# Altium footprint library Metric_SMD.PcbLib: 185 footprints (part 7 of 12)
Each footprint in its own frame and in the unit in brackets; x right, y up, seen from the top. Pads: shape width x height; smd on the part's side, far side on the other; paste and mask are expansions set on the pad; w line width, h text height; cw(c..) or ccw(c..) is an arc to the next point about the centre after c.
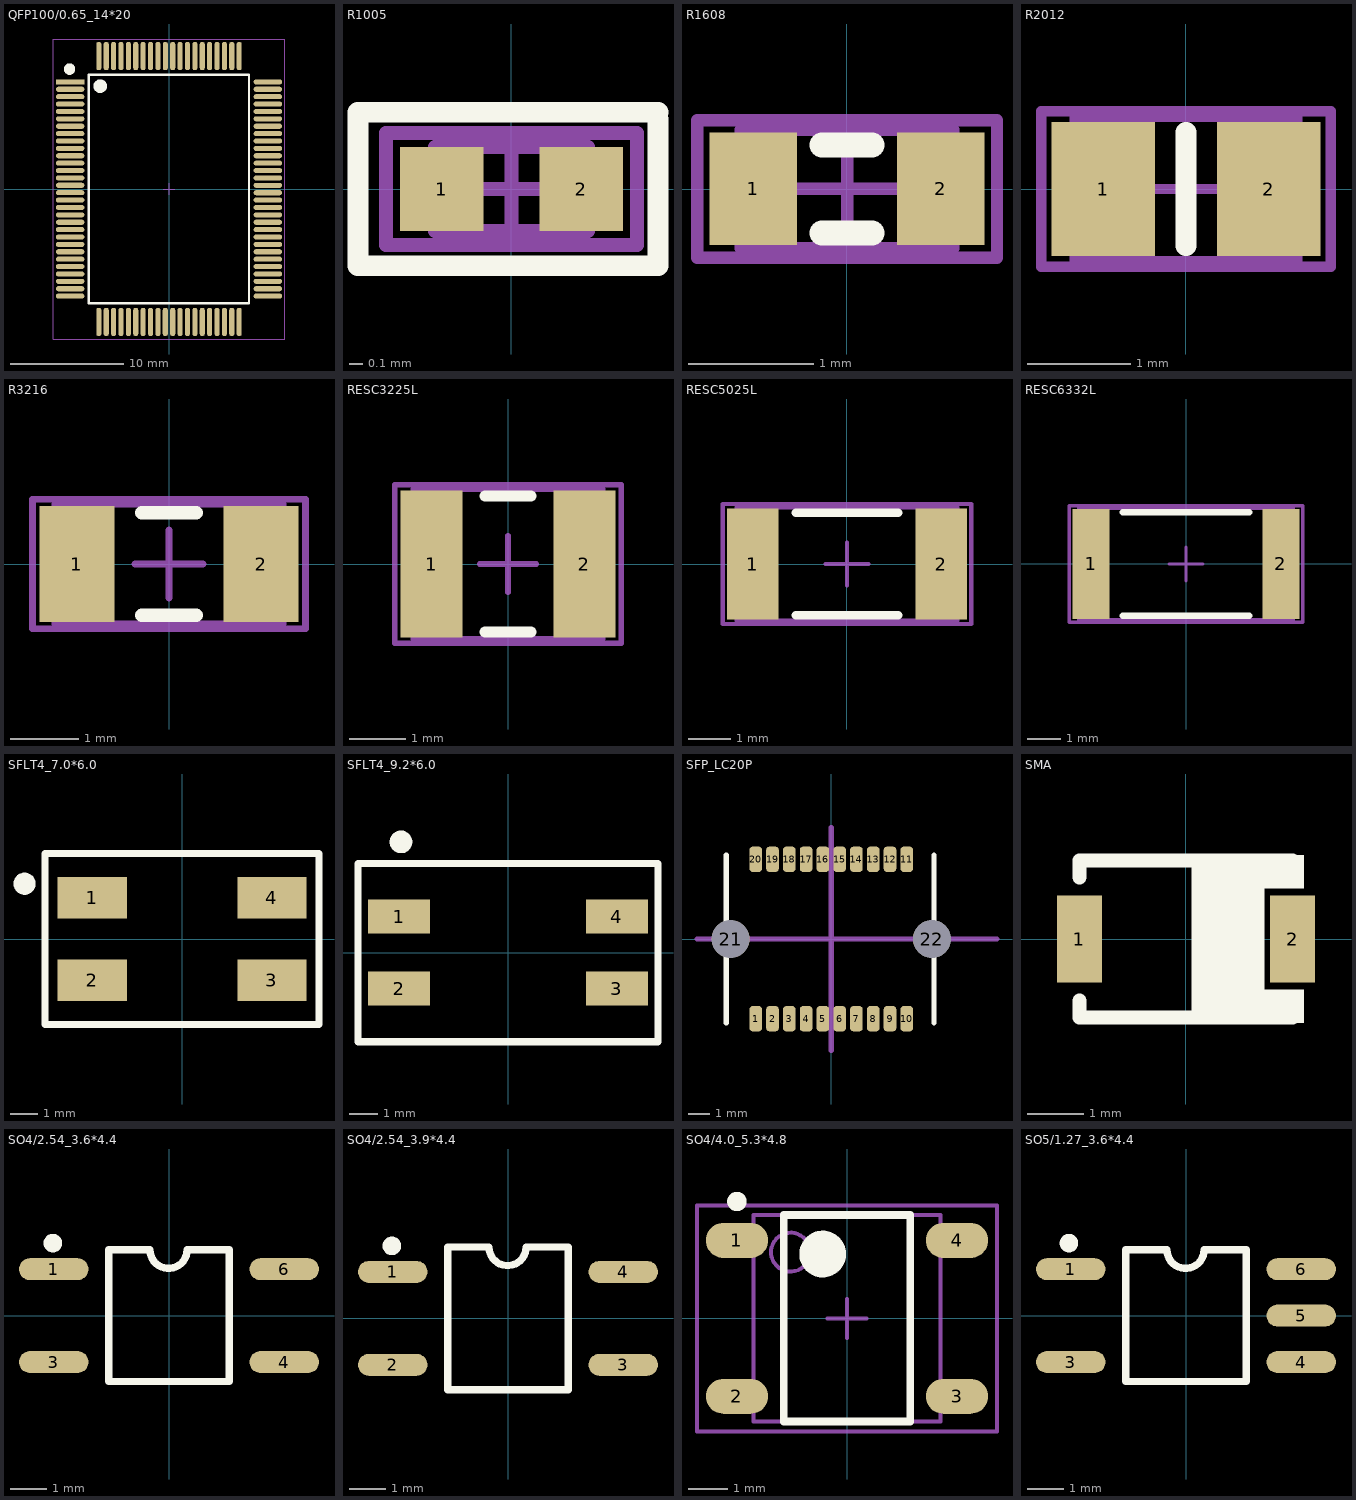
[diagram p6: the footprints below, top view; thin cyan lines are the x and y axes]

## QFP100/0.65_14*20 [mm] "QFP, 100-Leads, Body 25.1x19.1mm (max), Pitch 0.65mm, IPC Medium Density"
height 3
pads (100):
  rect 2.5x0.45 smd: 1(-8.7,9.425)
  oval 2.5x0.45 smd: 2(-8.7,8.775) 3(-8.7,8.125) 4(-8.7,7.475) 5(-8.7,6.825) 6(-8.7,6.175) 7(-8.7,5.525) 8(-8.7,4.875) 9(-8.7,4.225) 10(-8.7,3.575) 11(-8.7,2.925) 12(-8.7,2.275) 13(-8.7,1.625) 14(-8.7,0.975) 15(-8.7,0.325) 16(-8.7,-0.325) 17(-8.7,-0.975) 18(-8.7,-1.625) 19(-8.7,-2.275) 20(-8.7,-2.925) 21(-8.7,-3.575) 22(-8.7,-4.225) 23(-8.7,-4.875) 24(-8.7,-5.525) 25(-8.7,-6.175) 26(-8.7,-6.825) 27(-8.7,-7.475) 28(-8.7,-8.125) 29(-8.7,-8.775) 30(-8.7,-9.425) 51(8.7,-9.425) 52(8.7,-8.775) 53(8.7,-8.125) 54(8.7,-7.475) 55(8.7,-6.825) 56(8.7,-6.175) 57(8.7,-5.525) 58(8.7,-4.875) 59(8.7,-4.225) 60(8.7,-3.575) 61(8.7,-2.925) 62(8.7,-2.275) 63(8.7,-1.625) 64(8.7,-0.975) 65(8.7,-0.325) 66(8.7,0.325) 67(8.7,0.975) 68(8.7,1.625) 69(8.7,2.275) 70(8.7,2.925) 71(8.7,3.575) 72(8.7,4.225) 73(8.7,4.875) 74(8.7,5.525) 75(8.7,6.175) 76(8.7,6.825) 77(8.7,7.475) 78(8.7,8.125) 79(8.7,8.775) 80(8.7,9.425)
  oval 0.45x2.5 smd: 31(-6.175,-11.7) 32(-5.525,-11.7) 33(-4.875,-11.7) 34(-4.225,-11.7) 35(-3.575,-11.7) 36(-2.925,-11.7) 37(-2.275,-11.7) 38(-1.625,-11.7) 39(-0.975,-11.7) 40(-0.325,-11.7) 41(0.325,-11.7) 42(0.975,-11.7) 43(1.625,-11.7) 44(2.275,-11.7) 45(2.925,-11.7) 46(3.575,-11.7) 47(4.225,-11.7) 48(4.875,-11.7) 49(5.525,-11.7) 50(6.175,-11.7) 81(6.175,11.7) 82(5.525,11.7) 83(4.875,11.7) 84(4.225,11.7) 85(3.575,11.7) 86(2.925,11.7) 87(2.275,11.7) 88(1.625,11.7) 89(0.975,11.7) 90(0.325,11.7) 91(-0.325,11.7) 92(-0.975,11.7) 93(-1.625,11.7) 94(-2.275,11.7) 95(-2.925,11.7) 96(-3.575,11.7) 97(-4.225,11.7) 98(-4.875,11.7) 99(-5.525,11.7) 100(-6.175,11.7)
Top Overlay:
  circle w0.6: c-6.05,9.05 r0.3
  circle w0.5: c-8.75,10.55 r0.25
  lines w0.2: -7.05,-10.05 7.05,-10.05 7.05,10.05 -7.05,10.05 -7.05,-10.05
Mechanical 13:
  circle w0.1: c-6.05,9.05 r0.5
  lines w0.1: -7,-10 7,-10 7,10 -7,10 -7,-10
Mechanical 15:
  lines w0.1: -0.5,0 0.5,0 ; 0,-0.5 0,0.5 ; -10.2,-13.2 10.2,-13.2 10.2,13.2 -10.2,13.2 -10.2,-13.2
3D body: height 3, standoff 0.11, extent -7,-10 7,10

## R1005 [mm] "Chip Resistor, Body 1.1x0.5mm, IPC High Density"
height 2.54
pads (2):
  rect 0.6x0.6 smd: 1(-0.5,0) 2(0.5,0)
Top Overlay:
  lines w0.15: 1.05,0.5 1.05,-0.55 -1.1,-0.55 -1.1,0.55 1.05,0.55
Mechanical 13:
  lines w0.1: -0.55,-0.3 0.55,-0.3 0.55,0.3 -0.55,0.3 -0.55,-0.3
Mechanical 15:
  lines w0.1: -0.3,0 0.3,0 ; 0,-0.3 0,0.3 ; -0.9,-0.4 0.9,-0.4 0.9,0.4 -0.9,0.4 -0.9,-0.4
3D body: height 2.54, standoff 0, extent -0.55,-0.3 0.55,0.3

## R1608 [mm] "Chip Resistor, Body 1.6x0.8mm, IPC High Density"
height 0.9
pads (2):
  rect 0.7x0.9 smd: 1(-0.75,0) 2(0.75,0)
Top Overlay:
  lines w0.2: -0.2,-0.35 0.2,-0.35 ; -0.2,0.35 0.2,0.35
Mechanical 13:
  lines w0.1: -0.85,-0.475 -0.85,0.475 0.85,0.475 0.85,-0.475 -0.85,-0.475
Mechanical 15:
  lines w0.1: -0.475,0 0.475,0 ; 0,-0.475 0,0.475 ; -1.2,-0.55 -1.2,0.55 1.2,0.55 1.2,-0.55 -1.2,-0.55
3D body: height 0.9, standoff 0, extent -0.85,-0.475 0.85,0.475

## R2012 [mm] "Chip Resistor, Body 2.0x1.3mm, IPC High Density"
height 2.54
pads (2):
  rect 1x1.3 smd: 1(-0.8,0) 2(0.8,0)
Top Overlay:
  lines w0.2: 0,-0.55 0,0.55
Mechanical 13:
  lines w0.1: -1.075,-0.7 -1.075,0.7 1.075,0.7 1.075,-0.7 -1.075,-0.7
Mechanical 15:
  lines w0.1: -0.5,0 0.5,0 ; 0,-0.5 0,0.5 ; -1.4,-0.75 -1.4,0.75 1.4,0.75 1.4,-0.75 -1.4,-0.75
3D body: height 2.54, standoff 0, extent -1.075,-0.7 1.075,0.7

## R3216 [mm] "Chip Resistor, Body 3.2x1.6mm, IPC High Density"
height 2.54
pads (2):
  rect 1.1x1.7 smd: 1(-1.35,0) 2(1.35,0)
Top Overlay:
  lines w0.2: -0.4,-0.75 0.4,-0.75 ; -0.4,0.75 0.4,0.75
Mechanical 13:
  lines w0.1: -1.675,-0.875 1.675,-0.875 1.675,0.875 -1.675,0.875 -1.675,-0.875
Mechanical 15:
  lines w0.1: -0.5,0 0.5,0 ; 0,-0.5 0,0.5 ; -2,-0.95 2,-0.95 2,0.95 -2,0.95 -2,-0.95
3D body: height 2.54, standoff 0, extent -1.675,-0.875 1.675,0.875

## RESC3225L [mm] "Chip Resistor, Body 3.2x2.5mm, IPC High Density"
height 0.9
pads (2):
  rect 1.1x2.6 smd: 1(-1.35,0) 2(1.35,0)
Top Overlay:
  lines w0.2: -0.4,-1.2 0.4,-1.2 ; -0.4,1.2 0.4,1.2
Mechanical 13:
  lines w0.1: -1.675,-1.32 -1.675,1.32 1.675,1.32 1.675,-1.32 -1.675,-1.32
Mechanical 15:
  lines w0.1: -0.5,0 0.5,0 ; 0,-0.5 0,0.5 ; -2,-1.4 -2,1.4 2,1.4 2,-1.4 -2,-1.4
3D body: height 0.9, standoff 0, extent -1.675,-1.32 1.675,1.32

## RESC5025L [mm] "Chip Resistor, Body 5.0x2.5mm, IPC High Density"
height 0.9
pads (2):
  rect 1.2x2.6 smd: 1(-2.2,0) 2(2.2,0)
Top Overlay:
  lines w0.2: -1.2,-1.2 1.2,-1.2 ; -1.2,1.2 1.2,1.2
Mechanical 13:
  lines w0.1: -2.575,-1.325 -2.575,1.325 2.575,1.325 2.575,-1.325 -2.575,-1.325
Mechanical 15:
  lines w0.1: -0.5,0 0.5,0 ; 0,-0.5 0,0.5 ; -2.9,-1.4 -2.9,1.4 2.9,1.4 2.9,-1.4 -2.9,-1.4
3D body: height 0.9, standoff 0, extent -2.575,-1.325 2.575,1.325

## RESC6332L [mm] "Chip Resistor, Body 6.3x3.2mm, IPC High Density"
height 0.9
pads (2):
  rect 1.1x3.3 smd: 1(-2.85,0) 2(2.85,0)
Top Overlay:
  lines w0.2: -1.9,-1.55 1.9,-1.55 ; -1.9,1.55 1.9,1.55
Mechanical 13:
  lines w0.1: -3.225,-1.675 -3.225,1.675 3.225,1.675 3.225,-1.675 -3.225,-1.675
Mechanical 15:
  lines w0.1: -0.5,0 0.5,0 ; 0,-0.5 0,0.5 ; -3.5,-1.75 -3.5,1.75 3.5,1.75 3.5,-1.75 -3.5,-1.75
3D body: height 0.9, standoff 0, extent -3.225,-1.675 3.225,1.675

## SFLT4_7.0*6.0 [mm] "7.0X6.0mm"
height 3.5
pads (4):
  rect 2.5x1.5 smd: 1(-3.25,1.5) 2(-3.25,-1.5) 3(3.25,-1.5) 4(3.25,1.5)
Top Overlay:
  circle w0.4: c-5.7,2 r0.2
  lines w0.254: -4.953,-3.1 4.953,-3.1 4.953,3.1 -4.953,3.1 -4.953,-3.1

## SFLT4_9.2*6.0 [mm] "9.2X6.0mm"
height 5.3
pads (4):
  rect 2.2x1.2 smd: 1(-3.85,1.27) 2(-3.85,-1.27) 3(3.85,-1.27) 4(3.85,1.27)
Top Overlay:
  circle w0.4: c-3.781,3.912 r0.2
  lines w0.254: -5.3,-3.15 5.3,-3.15 5.3,3.15 -5.3,3.15 -5.3,-3.15
3D body "User Library-Bourns - SRF0905.STEP": height 4.98, standoff -0.02, extent -4.587,-2.994 4.613,3.006

## SFP_LC20P [mm] "pitch0.8mm"
pads (22):
  rrect50% 0.6x1.2 smd: 1(-3.6,-3.8) 2(-2.8,-3.8) 3(-2,-3.8) 4(-1.2,-3.8) 5(-0.4,-3.8) 6(0.4,-3.8) 7(1.2,-3.8) 8(2,-3.8) 9(2.8,-3.8) 10(3.6,-3.8) 11(3.6,3.8) 12(2.8,3.8) 13(2,3.8) 14(1.2,3.8) 15(0.4,3.8) 16(-0.4,3.8) 17(-1.2,3.8) 18(-2,3.8) 19(-2.8,3.8) 20(-3.6,3.8)
  round 1.8 hole 1.8: 21(-4.8,0) 22(4.8,0)
Top Overlay:
  lines w0.254: -5,-4 -5,4 ; 4.9,-4 4.9,4
Mechanical 13:
  lines w0.254: -6.4,0 7.9,0 ; 0,-5.3 0,5.3
3D body: height 3, standoff 2, extent -4.4,3.2 4.4,4
3D body: height 5, standoff 0, extent -5,-3.8 4.9,3.8

## SMA [mm] "SMA标准封装"
height 2
pads (2):
  rect 0.8x1.55 smd: 1(-1.9,0) 2(1.9,0)
Top Overlay:
  region: 1.4,1.4 0.1,1.4 0.1,-1.4 1.4,-1.4
  region: 2.1,-0.9 1.4,-0.9 1.4,-1.5 2.1,-1.5
  region: 2.1,1.5 1.4,1.5 1.4,0.9 2.1,0.9
  lines w0.254: -1.9,-1.1 -1.9,-1.4 1.9,-1.4 ; -1.9,1.1 -1.9,1.4 1.9,1.4

## SO4/2.54_3.6*4.4 [mm] "SOIC, 4-Leads, Body 3.6X4.4mm, Pitch 2.54mm"
height 2.7
pads (4):
  oval 1.9x0.6 smd: 1(-3.15,1.27) 3(-3.15,-1.27) 4(3.15,-1.27) 6(3.15,1.27)
Top Overlay:
  circle w0.254: c-3.175,1.981 r0.127
  lines w0.2: -1.65,-1.8 1.65,-1.8 1.65,1.8 0.495,1.8 cw(c-0.013,1.8) -0.521,1.8 -1.65,1.8 -1.65,-1.8
3D body: height 2.7, standoff 0, extent -2.21,-1.8 2.21,1.8

## SO4/2.54_3.9*4.4 [mm] "SOP, 4-Leads, Body 3.9X4.4mm, Pitch 2.54mm"
height 2.1
pads (4):
  oval 1.9x0.6 smd: 1(-3.15,1.27) 2(-3.15,-1.27) 3(3.15,-1.27) 4(3.15,1.27)
Top Overlay:
  circle w0.254: c-3.175,1.981 r0.127
  lines w0.2: -1.65,-1.95 1.65,-1.95 1.65,1.95 0.495,1.95 cw(c-0.013,1.95) -0.521,1.95 -1.65,1.95 -1.65,-1.95
3D body: height 2.1, standoff 0, extent -2.21,-1.95 2.21,1.95

## SO4/4.0_5.3*4.8 [mm] "SOP, 4-Leads, Body 5.3x4.8mm (max), Pitch 4.00mm, IPC Medium Density"
height 1.6
pads (4):
  oval 1.6x0.9 smd: 1(-2.825,2) 2(-2.825,-2) 3(2.825,-2) 4(2.825,2)
Top Overlay:
  circle w0.6: c-0.625,1.65 r0.3
  circle w0.25: c-2.825,3 r0.125
  lines w0.2: -1.625,-2.65 1.625,-2.65 1.625,2.65 -1.625,2.65 -1.625,-2.65
Mechanical 13:
  circle w0.1: c-1.45,1.7 r0.5
  lines w0.1: -2.4,-2.65 2.4,-2.65 2.4,2.65 -2.4,2.65 -2.4,-2.65
Mechanical 15:
  lines w0.1: -0.5,0 0.5,0 ; 0,-0.5 0,0.5 ; -3.85,-2.9 3.85,-2.9 3.85,2.9 -3.85,2.9 -3.85,-2.9
3D body: height 1.6, standoff 0.02, extent -2.4,-2.65 2.4,2.65

## SO5/1.27_3.6*4.4 [mm] "SOIC, 5-Leads, Body 3.6X4.4mm, Pitch 1.27mm"
height 2.7
pads (5):
  oval 1.9x0.6 smd: 1(-3.15,1.27) 3(-3.15,-1.27) 4(3.15,-1.27) 5(3.15,0) 6(3.15,1.27)
Top Overlay:
  circle w0.254: c-3.2,1.981 r0.127
  lines w0.2: -1.65,-1.8 -1.65,1.8 -0.521,1.8 ccw(c-0.013,1.8) 0.495,1.8 1.65,1.8 1.65,-1.8 -1.65,-1.8
3D body: height 2.5, standoff 0, extent -2.21,-1.8 2.21,1.8